# Altium integrated library ALTIUM-WR-FPC-rev18c.IntLib: 212 symbols (part 1 of 2) (continued)
## 686104183822 (continued)
SMT ZIF Connectors WR-FPC, Vertical, Type A, pitch 1 mm, 4 pins; Part Number: 686104183822; Rated Current: 1 A; Contact Resistance: 30 mOhm; Withstanding Voltage: 250 VAC; Working Voltage: 125 VAC; Pin Number: 4; Pitch: 1 mm; Contact Design: Type A; ComponentLink1Description: Manufacturer; ComponentLink1URL: http://www.we-online.de; ComponentLink2Description: Datasheet; ComponentLink2URL: https://katalog.we-online.de/em/datasheet/686104183822.pdf; Published Date: August 2018; Publisher: Wurth Elektronik; Operating Temperature: -25 to 85 degC; Packaging: Tape and Reel; Mounting Technology: SMT; Orientation: Vertical
footprint 686104183822
pins: 1, 2, 3, 4, MP1, MP2, MP3, MP4

## 686105183822
designator J?
SMT ZIF Connectors WR-FPC, Vertical, Type A, pitch 1 mm, 5 pins; Part Number: 686105183822; Rated Current: 1 A; Contact Resistance: 30 mOhm; Withstanding Voltage: 250 VAC; Working Voltage: 125 VAC; Pin Number: 5; Pitch: 1 mm; Contact Design: Type A; ComponentLink1Description: Manufacturer; ComponentLink1URL: http://www.we-online.de; ComponentLink2Description: Datasheet; ComponentLink2URL: https://katalog.we-online.de/em/datasheet/686105183822.pdf; Published Date: August 2018; Publisher: Wurth Elektronik; Operating Temperature: -25 to 85 degC; Packaging: Tape and Reel; Mounting Technology: SMT; Orientation: Vertical
footprint 686105183822
pins: 1, 2, 3, 4, 5, MP1, MP2, MP3, MP4

## 686106148922
designator J?
SMT ZIF Connectors Hinge Type WR-FPC, Horizontal, Bottom Contact, pitch 1 mm, 6 pins; Part Number: 686106148922; Rated Current: 1 A; Contact Resistance: 50 mOhm; Withstanding Voltage: 500 VAC; Working Voltage: 100 VAC; Pin Number: 6; Pitch: 1 mm; ComponentLink1Description: Manufacturer; ComponentLink1URL: http://www.we-online.de; ComponentLink2Description: Datasheet; ComponentLink2URL: https://katalog.we-online.de/em/datasheet/686106148922.pdf; Published Date: August 2018; Publisher: Wurth Elektronik; Operating Temperature: -40 to 105 degC; Packaging: Tape and Reel; Mounting Technology: SMT; Orientation: Horizontal; Contact Design: Bottom Contact
footprint 686106148922
pins: 1, 2, 3, 4, 5, 6, MP1, MP2

## 686106183422
designator J?
SMT ZIF Connectors Low Profile WR-FPC, Horizontal, Top Contact, pitch 1 mm, 6 pins; Part Number: 686106183422; Rated Current: 0.8 A; Contact Resistance: 30 mOhm; Withstanding Voltage: 250 VAC; Working Voltage: 50 VAC; Pin Number: 6; Pitch: 1 mm; ComponentLink1Description: Manufacturer; ComponentLink1URL: http://www.we-online.de; ComponentLink2Description: Datasheet; ComponentLink2URL: https://katalog.we-online.de/em/datasheet/686106183422.pdf; Published Date: August 2018; Publisher: Wurth Elektronik; Operating Temperature: -25 to 85 degC; Packaging: Tape and Reel; Mounting Technology: SMT; Orientation: Horizontal; Contact Design: Top Contact
footprint 686106183422
pins: 1, 2, 3, 4, 5, 6, MP1, MP2

## 686106183522
designator J?
SMT ZIF Connectors Low Profile WR-FPC, Horizontal, Bottom Contact, pitch 1 mm, 6 pins; Part Number: 686106183522; Rated Current: 0.8 A; Contact Resistance: 30 mOhm; Withstanding Voltage: 250 VAC; Working Voltage: 50 VAC; Pin Number: 6; Pitch: 1 mm; ComponentLink1Description: Manufacturer; ComponentLink1URL: http://www.we-online.de; ComponentLink2Description: Datasheet; ComponentLink2URL: https://katalog.we-online.de/em/datasheet/686106183522.pdf; Published Date: August 2018; Publisher: Wurth Elektronik; Operating Temperature: -25 to 85 degC; Packaging: Tape and Reel; Mounting Technology: SMT; Orientation: Horizontal; Contact Design: Bottom Contact
footprint 686106183522
pins: 1, 2, 3, 4, 5, 6, MP1, MP2

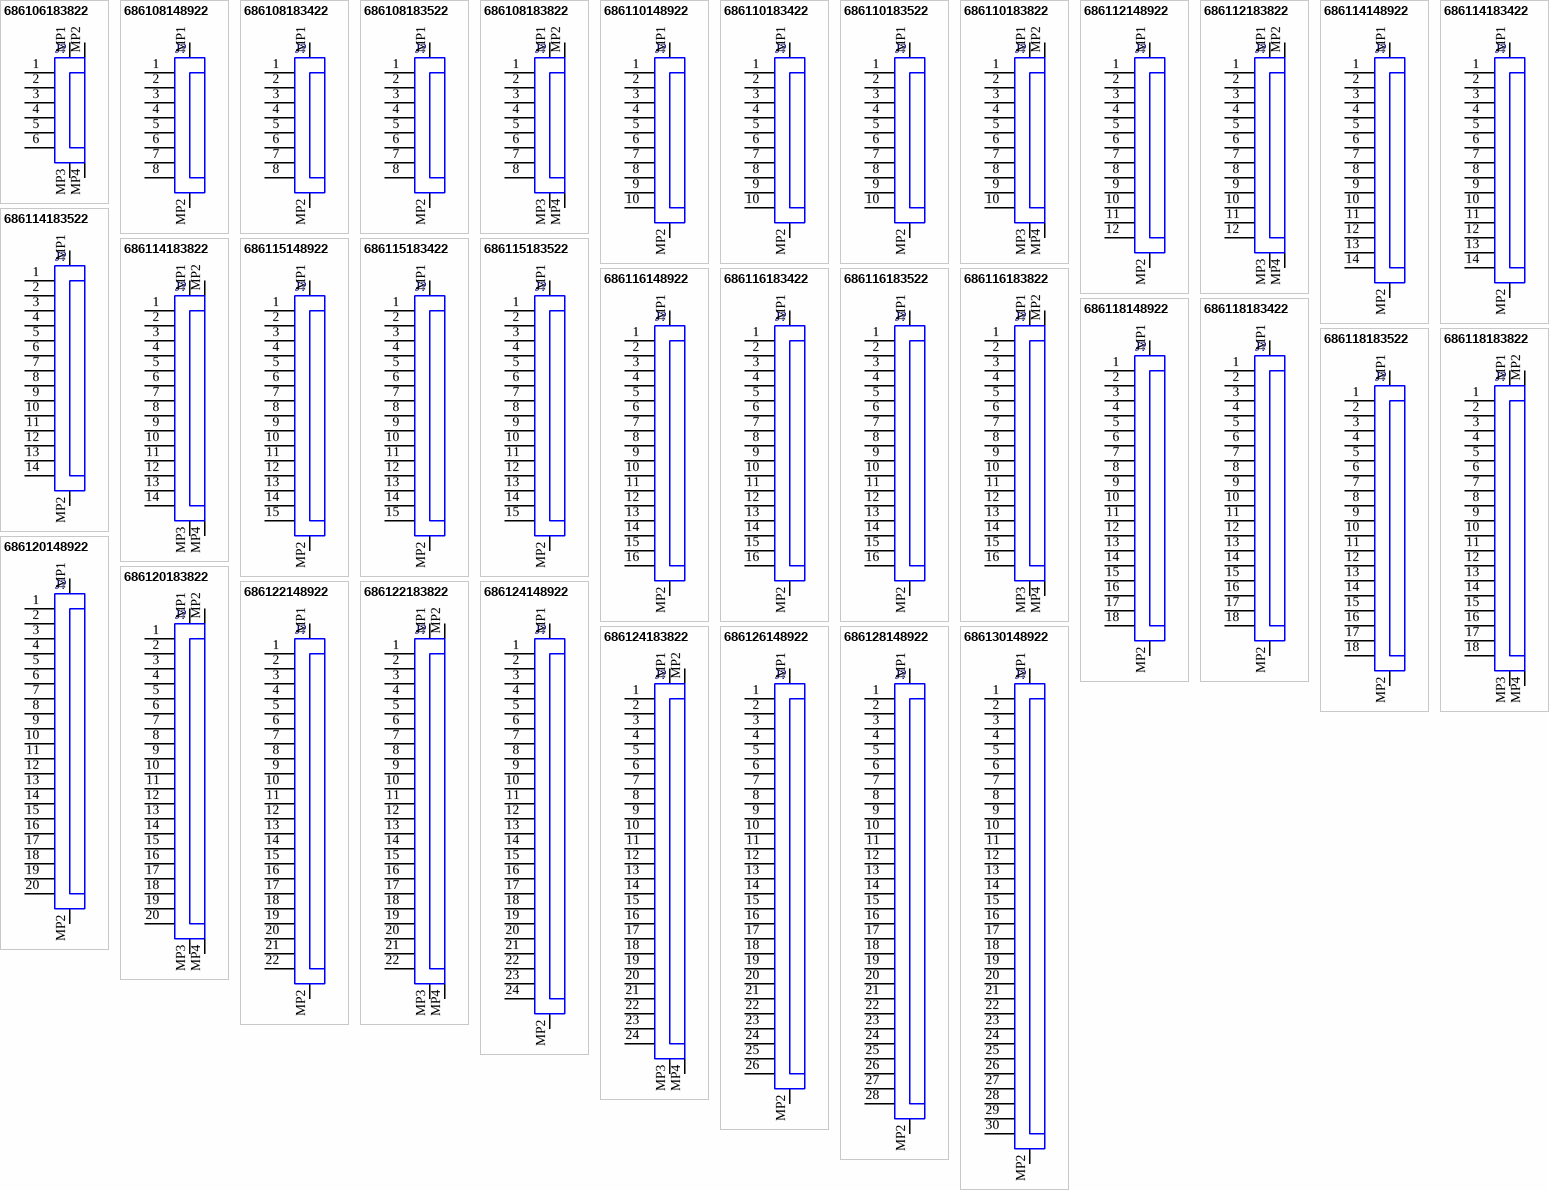
[diagram p1: symbols 686106183822 to 686130148922]

## 686106183822
designator J?
SMT ZIF Connectors WR-FPC, Vertical, Type A, pitch 1 mm, 6 pins; Part Number: 686106183822; Rated Current: 1 A; Contact Resistance: 30 mOhm; Withstanding Voltage: 250 VAC; Working Voltage: 125 VAC; Pin Number: 6; Pitch: 1 mm; Contact Design: Type A; ComponentLink1Description: Manufacturer; ComponentLink1URL: http://www.we-online.de; ComponentLink2Description: Datasheet; ComponentLink2URL: https://katalog.we-online.de/em/datasheet/686106183822.pdf; Published Date: August 2018; Publisher: Wurth Elektronik; Operating Temperature: -25 to 85 degC; Packaging: Tape and Reel; Mounting Technology: SMT; Orientation: Vertical
footprint 686106183822
pins: 1, 2, 3, 4, 5, 6, MP1, MP2, MP3, MP4

## 686108148922
designator J?
SMT ZIF Connectors Hinge Type WR-FPC, Horizontal, Bottom Contact, pitch 1 mm, 8 pins; Part Number: 686108148922; Rated Current: 1 A; Contact Resistance: 50 mOhm; Withstanding Voltage: 500 VAC; Working Voltage: 100 VAC; Pin Number: 8; Pitch: 1 mm; ComponentLink1Description: Manufacturer; ComponentLink1URL: http://www.we-online.de; ComponentLink2Description: Datasheet; ComponentLink2URL: https://katalog.we-online.de/em/datasheet/686108148922.pdf; Published Date: August 2018; Publisher: Wurth Elektronik; Operating Temperature: -40 to 105 degC; Packaging: Tape and Reel; Mounting Technology: SMT; Orientation: Horizontal; Contact Design: Bottom Contact
footprint 686108148922
pins: 1, 2, 3, 4, 5, 6, 7, 8, MP1, MP2

## 686108183422
designator J?
SMT ZIF Connectors Low Profile WR-FPC, Horizontal, Top Contact, pitch 1 mm, 8 pins; Part Number: 686108183422; Rated Current: 0.8 A; Contact Resistance: 30 mOhm; Withstanding Voltage: 250 VAC; Working Voltage: 50 VAC; Pin Number: 8; Pitch: 1 mm; ComponentLink1Description: Manufacturer; ComponentLink1URL: http://www.we-online.de; ComponentLink2Description: Datasheet; ComponentLink2URL: https://katalog.we-online.de/em/datasheet/686108183422.pdf; Published Date: August 2018; Publisher: Wurth Elektronik; Operating Temperature: -25 to 85 degC; Packaging: Tape and Reel; Mounting Technology: SMT; Orientation: Horizontal; Contact Design: Top Contact
footprint 686108183422
pins: 1, 2, 3, 4, 5, 6, 7, 8, MP1, MP2

## 686108183522
designator J?
SMT ZIF Connectors Low Profile WR-FPC, Horizontal, Bottom Contact, pitch 1 mm, 8 pins; Part Number: 686108183522; Rated Current: 0.8 A; Contact Resistance: 30 mOhm; Withstanding Voltage: 250 VAC; Working Voltage: 50 VAC; Pin Number: 8; Pitch: 1 mm; ComponentLink1Description: Manufacturer; ComponentLink1URL: http://www.we-online.de; ComponentLink2Description: Datasheet; ComponentLink2URL: https://katalog.we-online.de/em/datasheet/686108183522.pdf; Published Date: August 2018; Publisher: Wurth Elektronik; Operating Temperature: -25 to 85 degC; Packaging: Tape and Reel; Mounting Technology: SMT; Orientation: Horizontal; Contact Design: Bottom Contact
footprint 686108183522
pins: 1, 2, 3, 4, 5, 6, 7, 8, MP1, MP2

## 686108183822
designator J?
SMT ZIF Connectors WR-FPC, Vertical, Type A, pitch 1 mm, 8 pins; Part Number: 686108183822; Rated Current: 1 A; Contact Resistance: 30 mOhm; Withstanding Voltage: 250 VAC; Working Voltage: 125 VAC; Pin Number: 8; Pitch: 1 mm; Contact Design: Type A; ComponentLink1Description: Manufacturer; ComponentLink1URL: http://www.we-online.de; ComponentLink2Description: Datasheet; ComponentLink2URL: https://katalog.we-online.de/em/datasheet/686108183822.pdf; Published Date: August 2018; Publisher: Wurth Elektronik; Operating Temperature: -25 to 85 degC; Packaging: Tape and Reel; Mounting Technology: SMT; Orientation: Vertical
footprint 686108183822
pins: 1, 2, 3, 4, 5, 6, 7, 8, MP1, MP2, MP3, MP4

## 686110148922
designator J?
SMT ZIF Connectors Hinge Type WR-FPC, Horizontal, Bottom Contact, pitch 1 mm, 10 pins; Part Number: 686110148922; Rated Current: 1 A; Contact Resistance: 50 mOhm; Withstanding Voltage: 500 VAC; Working Voltage: 100 VAC; Pin Number: 10; Pitch: 1 mm; ComponentLink1Description: Manufacturer; ComponentLink1URL: http://www.we-online.de; ComponentLink2Description: Datasheet; ComponentLink2URL: https://katalog.we-online.de/em/datasheet/686110148922.pdf; Published Date: August 2018; Publisher: Wurth Elektronik; Operating Temperature: -40 to 105 degC; Packaging: Tape and Reel; Mounting Technology: SMT; Orientation: Horizontal; Contact Design: Bottom Contact
footprint 686110148922
pins: 1, 2, 3, 4, 5, 6, 7, 8, 9, 10, MP1, MP2

## 686110183422
designator J?
SMT ZIF Connectors Low Profile WR-FPC, Horizontal, Top Contact, pitch 1 mm, 10 pins; Part Number: 686110183422; Rated Current: 0.8 A; Contact Resistance: 30 mOhm; Withstanding Voltage: 250 VAC; Working Voltage: 50 VAC; Pin Number: 10; Pitch: 1 mm; ComponentLink1Description: Manufacturer; ComponentLink1URL: http://www.we-online.de; ComponentLink2Description: Datasheet; ComponentLink2URL: https://katalog.we-online.de/em/datasheet/686110183422.pdf; Published Date: August 2018; Publisher: Wurth Elektronik; Operating Temperature: -25 to 85 degC; Packaging: Tape and Reel; Mounting Technology: SMT; Orientation: Horizontal; Contact Design: Top Contact
footprint 686110183422
pins: 1, 2, 3, 4, 5, 6, 7, 8, 9, 10, MP1, MP2

## 686110183522
designator J?
SMT ZIF Connectors Low Profile WR-FPC, Horizontal, Bottom Contact, pitch 1 mm, 10 pins; Part Number: 686110183522; Rated Current: 0.8 A; Contact Resistance: 30 mOhm; Withstanding Voltage: 250 VAC; Working Voltage: 50 VAC; Pin Number: 10; Pitch: 1 mm; ComponentLink1Description: Manufacturer; ComponentLink1URL: http://www.we-online.de; ComponentLink2Description: Datasheet; ComponentLink2URL: https://katalog.we-online.de/em/datasheet/686110183522.pdf; Published Date: August 2018; Publisher: Wurth Elektronik; Operating Temperature: -25 to 85 degC; Packaging: Tape and Reel; Mounting Technology: SMT; Orientation: Horizontal; Contact Design: Bottom Contact
footprint 686110183522
pins: 1, 2, 3, 4, 5, 6, 7, 8, 9, 10, MP1, MP2

## 686110183822
designator J?
SMT ZIF Connectors WR-FPC, Vertical, Type A, pitch 1 mm, 10 pins; Part Number: 686110183822; Rated Current: 1 A; Contact Resistance: 30 mOhm; Withstanding Voltage: 250 VAC; Working Voltage: 125 VAC; Pin Number: 10; Pitch: 1 mm; Contact Design: Type A; ComponentLink1Description: Manufacturer; ComponentLink1URL: http://www.we-online.de; ComponentLink2Description: Datasheet; ComponentLink2URL: https://katalog.we-online.de/em/datasheet/686110183822.pdf; Published Date: August 2018; Publisher: Wurth Elektronik; Operating Temperature: -25 to 85 degC; Packaging: Tape and Reel; Mounting Technology: SMT; Orientation: Vertical
footprint 686110183822
pins: 1, 2, 3, 4, 5, 6, 7, 8, 9, 10, MP1, MP2, MP3, MP4

## 686112148922
designator J?
SMT ZIF Connectors Hinge Type WR-FPC, Horizontal, Bottom Contact, pitch 1 mm, 12 pins; Part Number: 686112148922; Rated Current: 1 A; Contact Resistance: 50 mOhm; Withstanding Voltage: 500 VAC; Working Voltage: 100 VAC; Pin Number: 12; Pitch: 1 mm; ComponentLink1Description: Manufacturer; ComponentLink1URL: http://www.we-online.de; ComponentLink2Description: Datasheet; ComponentLink2URL: https://katalog.we-online.de/em/datasheet/686112148922.pdf; Published Date: August 2018; Publisher: Wurth Elektronik; Operating Temperature: -40 to 105 degC; Packaging: Tape and Reel; Mounting Technology: SMT; Orientation: Horizontal; Contact Design: Bottom Contact
footprint 686112148922
pins: 1, 2, 3, 4, 5, 6, 7, 8, 9, 10, 11, 12, MP1, MP2

## 686112183822
designator J?
SMT ZIF Connectors WR-FPC, Vertical, Type A, pitch 1 mm, 12 pins; Part Number: 686112183822; Rated Current: 1 A; Contact Resistance: 30 mOhm; Withstanding Voltage: 250 VAC; Working Voltage: 125 VAC; Pin Number: 12; Pitch: 1 mm; Contact Design: Type A; ComponentLink1Description: Manufacturer; ComponentLink1URL: http://www.we-online.de; ComponentLink2Description: Datasheet; ComponentLink2URL: https://katalog.we-online.de/em/datasheet/686112183822.pdf; Published Date: August 2018; Publisher: Wurth Elektronik; Operating Temperature: -25 to 85 degC; Packaging: Tape and Reel; Mounting Technology: SMT; Orientation: Vertical
footprint 686112183822
pins: 1, 2, 3, 4, 5, 6, 7, 8, 9, 10, 11, 12, MP1, MP2, MP3, MP4

## 686114148922
designator J?
SMT ZIF Connectors Hinge Type WR-FPC, Horizontal, Bottom Contact, pitch 1 mm, 14 pins; Part Number: 686114148922; Rated Current: 1 A; Contact Resistance: 50 mOhm; Withstanding Voltage: 500 VAC; Working Voltage: 100 VAC; Pin Number: 14; Pitch: 1 mm; ComponentLink1Description: Manufacturer; ComponentLink1URL: http://www.we-online.de; ComponentLink2Description: Datasheet; ComponentLink2URL: https://katalog.we-online.de/em/datasheet/686114148922.pdf; Published Date: August 2018; Publisher: Wurth Elektronik; Operating Temperature: -40 to 105 degC; Packaging: Tape and Reel; Mounting Technology: SMT; Orientation: Horizontal; Contact Design: Bottom Contact
footprint 686114148922
pins: 1, 2, 3, 4, 5, 6, 7, 8, 9, 10, 11, 12, 13, 14, MP1, MP2

## 686114183422
designator J?
SMT ZIF Connectors Low Profile WR-FPC, Horizontal, Top Contact, pitch 1 mm, 14 pins; Part Number: 686114183422; Rated Current: 0.8 A; Contact Resistance: 30 mOhm; Withstanding Voltage: 250 VAC; Working Voltage: 50 VAC; Pin Number: 14; Pitch: 1 mm; ComponentLink1Description: Manufacturer; ComponentLink1URL: http://www.we-online.de; ComponentLink2Description: Datasheet; ComponentLink2URL: https://katalog.we-online.de/em/datasheet/686114183422.pdf; Published Date: August 2018; Publisher: Wurth Elektronik; Operating Temperature: -25 to 85 degC; Packaging: Tape and Reel; Mounting Technology: SMT; Orientation: Horizontal; Contact Design: Top Contact
footprint 686114183422
pins: 1, 2, 3, 4, 5, 6, 7, 8, 9, 10, 11, 12, 13, 14, MP1, MP2

## 686114183522
designator J?
SMT ZIF Connectors Low Profile WR-FPC, Horizontal, Bottom Contact, pitch 1 mm, 14 pins; Part Number: 686114183522; Rated Current: 0.8 A; Contact Resistance: 30 mOhm; Withstanding Voltage: 250 VAC; Working Voltage: 50 VAC; Pin Number: 14; Pitch: 1 mm; ComponentLink1Description: Manufacturer; ComponentLink1URL: http://www.we-online.de; ComponentLink2Description: Datasheet; ComponentLink2URL: https://katalog.we-online.de/em/datasheet/686114183522.pdf; Published Date: August 2018; Publisher: Wurth Elektronik; Operating Temperature: -25 to 85 degC; Packaging: Tape and Reel; Mounting Technology: SMT; Orientation: Horizontal; Contact Design: Bottom Contact
footprint 686114183522
pins: 1, 2, 3, 4, 5, 6, 7, 8, 9, 10, 11, 12, 13, 14, MP1, MP2

## 686114183822
designator J?
SMT ZIF Connectors WR-FPC, Vertical, Type A, pitch 1 mm, 14 pins; Part Number: 686114183822; Rated Current: 1 A; Contact Resistance: 30 mOhm; Withstanding Voltage: 250 VAC; Working Voltage: 125 VAC; Pin Number: 14; Pitch: 1 mm; Contact Design: Type A; ComponentLink1Description: Manufacturer; ComponentLink1URL: http://www.we-online.de; ComponentLink2Description: Datasheet; ComponentLink2URL: https://katalog.we-online.de/em/datasheet/686114183822.pdf; Published Date: August 2018; Publisher: Wurth Elektronik; Operating Temperature: -25 to 85 degC; Packaging: Tape and Reel; Mounting Technology: SMT; Orientation: Vertical
footprint 686114183822
pins: 1, 2, 3, 4, 5, 6, 7, 8, 9, 10, 11, 12, 13, 14, MP1, MP2, MP3, MP4

## 686115148922
designator J?
SMT ZIF Connectors Hinge Type WR-FPC, Horizontal, Bottom Contact, pitch 1 mm, 15 pins; Part Number: 686115148922; Rated Current: 1 A; Contact Resistance: 50 mOhm; Withstanding Voltage: 500 VAC; Working Voltage: 100 VAC; Pin Number: 15; Pitch: 1 mm; ComponentLink1Description: Manufacturer; ComponentLink1URL: http://www.we-online.de; ComponentLink2Description: Datasheet; ComponentLink2URL: https://katalog.we-online.de/em/datasheet/686115148922.pdf; Published Date: August 2018; Publisher: Wurth Elektronik; Operating Temperature: -40 to 105 degC; Packaging: Tape and Reel; Mounting Technology: SMT; Orientation: Horizontal; Contact Design: Bottom Contact
footprint 686115148922
pins: 1, 2, 3, 4, 5, 6, 7, 8, 9, 10, 11, 12, 13, 14, 15, MP1, MP2

## 686115183422
designator J?
SMT ZIF Connectors Low Profile WR-FPC, Horizontal, Top Contact, pitch 1 mm, 15 pins; Part Number: 686115183422; Rated Current: 0.8 A; Contact Resistance: 30 mOhm; Withstanding Voltage: 250 VAC; Working Voltage: 50 VAC; Pin Number: 15; Pitch: 1 mm; ComponentLink1Description: Manufacturer; ComponentLink1URL: http://www.we-online.de; ComponentLink2Description: Datasheet; ComponentLink2URL: https://katalog.we-online.de/em/datasheet/686115183422.pdf; Published Date: August 2018; Publisher: Wurth Elektronik; Operating Temperature: -25 to 85 degC; Packaging: Tape and Reel; Mounting Technology: SMT; Orientation: Horizontal; Contact Design: Top Contact
footprint 686115183422
pins: 1, 2, 3, 4, 5, 6, 7, 8, 9, 10, 11, 12, 13, 14, 15, MP1, MP2

## 686115183522
designator J?
SMT ZIF Connectors Low Profile WR-FPC, Horizontal, Bottom Contact, pitch 1 mm, 15 pins; Part Number: 686115183522; Rated Current: 0.8 A; Contact Resistance: 30 mOhm; Withstanding Voltage: 250 VAC; Working Voltage: 50 VAC; Pin Number: 15; Pitch: 1 mm; ComponentLink1Description: Manufacturer; ComponentLink1URL: http://www.we-online.de; ComponentLink2Description: Datasheet; ComponentLink2URL: https://katalog.we-online.de/em/datasheet/686115183522.pdf; Published Date: August 2018; Publisher: Wurth Elektronik; Operating Temperature: -25 to 85 degC; Packaging: Tape and Reel; Mounting Technology: SMT; Orientation: Horizontal; Contact Design: Bottom Contact
footprint 686115183522
pins: 1, 2, 3, 4, 5, 6, 7, 8, 9, 10, 11, 12, 13, 14, 15, MP1, MP2

## 686116148922
designator J?
SMT ZIF Connectors Hinge Type WR-FPC, Horizontal, Bottom Contact, pitch 1 mm, 16 pins; Part Number: 686116148922; Rated Current: 1 A; Contact Resistance: 50 mOhm; Withstanding Voltage: 500 VAC; Working Voltage: 100 VAC; Pin Number: 16; Pitch: 1 mm; ComponentLink1Description: Manufacturer; ComponentLink1URL: http://www.we-online.de; ComponentLink2Description: Datasheet; ComponentLink2URL: https://katalog.we-online.de/em/datasheet/686116148922.pdf; Published Date: August 2018; Publisher: Wurth Elektronik; Operating Temperature: -40 to 105 degC; Packaging: Tape and Reel; Mounting Technology: SMT; Orientation: Horizontal; Contact Design: Bottom Contact
footprint 686116148922
pins: 1, 2, 3, 4, 5, 6, 7, 8, 9, 10, 11, 12, 13, 14, 15, 16, MP1, MP2

## 686116183422
designator J?
SMT ZIF Connectors Low Profile WR-FPC, Horizontal, Top Contact, pitch 1 mm, 16 pins; Part Number: 686116183422; Rated Current: 0.8 A; Contact Resistance: 30 mOhm; Withstanding Voltage: 250 VAC; Working Voltage: 50 VAC; Pin Number: 16; Pitch: 1 mm; ComponentLink1Description: Manufacturer; ComponentLink1URL: http://www.we-online.de; ComponentLink2Description: Datasheet; ComponentLink2URL: https://katalog.we-online.de/em/datasheet/686116183422.pdf; Published Date: August 2018; Publisher: Wurth Elektronik; Operating Temperature: -25 to 85 degC; Packaging: Tape and Reel; Mounting Technology: SMT; Orientation: Horizontal; Contact Design: Top Contact
footprint 686116183422
pins: 1, 2, 3, 4, 5, 6, 7, 8, 9, 10, 11, 12, 13, 14, 15, 16, MP1, MP2

## 686116183522
designator J?
SMT ZIF Connectors Low Profile WR-FPC, Horizontal, Bottom Contact, pitch 1 mm, 16 pins; Part Number: 686116183522; Rated Current: 0.8 A; Contact Resistance: 30 mOhm; Withstanding Voltage: 250 VAC; Working Voltage: 50 VAC; Pin Number: 16; Pitch: 1 mm; ComponentLink1Description: Manufacturer; ComponentLink1URL: http://www.we-online.de; ComponentLink2Description: Datasheet; ComponentLink2URL: https://katalog.we-online.de/em/datasheet/686116183522.pdf; Published Date: August 2018; Publisher: Wurth Elektronik; Operating Temperature: -25 to 85 degC; Packaging: Tape and Reel; Mounting Technology: SMT; Orientation: Horizontal; Contact Design: Bottom Contact
footprint 686116183522
pins: 1, 2, 3, 4, 5, 6, 7, 8, 9, 10, 11, 12, 13, 14, 15, 16, MP1, MP2

## 686116183822
designator J?
SMT ZIF Connectors WR-FPC, Vertical, Type A, pitch 1 mm, 16 pins; Part Number: 686116183822; Rated Current: 1 A; Contact Resistance: 30 mOhm; Withstanding Voltage: 250 VAC; Working Voltage: 125 VAC; Pin Number: 16; Pitch: 1 mm; Contact Design: Type A; ComponentLink1Description: Manufacturer; ComponentLink1URL: http://www.we-online.de; ComponentLink2Description: Datasheet; ComponentLink2URL: https://katalog.we-online.de/em/datasheet/686116183822.pdf; Published Date: August 2018; Publisher: Wurth Elektronik; Operating Temperature: -25 to 85 degC; Packaging: Tape and Reel; Mounting Technology: SMT; Orientation: Vertical
footprint 686116183822
pins: 1, 2, 3, 4, 5, 6, 7, 8, 9, 10, 11, 12, 13, 14, 15, 16, MP1, MP2, MP3, MP4

## 686118148922
designator J?
SMT ZIF Connectors Hinge Type WR-FPC, Horizontal, Bottom Contact, pitch 1 mm, 18 pins; Part Number: 686118148922; Rated Current: 1 A; Contact Resistance: 50 mOhm; Withstanding Voltage: 500 VAC; Working Voltage: 100 VAC; Pin Number: 18; Pitch: 1 mm; ComponentLink1Description: Manufacturer; ComponentLink1URL: http://www.we-online.de; ComponentLink2Description: Datasheet; ComponentLink2URL: https://katalog.we-online.de/em/datasheet/686118148922.pdf; Published Date: August 2018; Publisher: Wurth Elektronik; Operating Temperature: -40 to 105 degC; Packaging: Tape and Reel; Mounting Technology: SMT; Orientation: Horizontal; Contact Design: Bottom Contact
footprint 686118148922
pins: 1, 2, 3, 4, 5, 6, 7, 8, 9, 10, 11, 12, 13, 14, 15, 16, 17, 18, MP1, MP2

## 686118183422
designator J?
SMT ZIF Connectors Low Profile WR-FPC, Horizontal, Top Contact, pitch 1 mm, 18 pins; Part Number: 686118183422; Rated Current: 0.8 A; Contact Resistance: 30 mOhm; Withstanding Voltage: 250 VAC; Working Voltage: 50 VAC; Pin Number: 18; Pitch: 1 mm; ComponentLink1Description: Manufacturer; ComponentLink1URL: http://www.we-online.de; ComponentLink2Description: Datasheet; ComponentLink2URL: https://katalog.we-online.de/em/datasheet/686118183422.pdf; Published Date: August 2018; Publisher: Wurth Elektronik; Operating Temperature: -25 to 85 degC; Packaging: Tape and Reel; Mounting Technology: SMT; Orientation: Horizontal; Contact Design: Top Contact
footprint 686118183422
pins: 1, 2, 3, 4, 5, 6, 7, 8, 9, 10, 11, 12, 13, 14, 15, 16, 17, 18, MP1, MP2

## 686118183522
designator J?
SMT ZIF Connectors Low Profile WR-FPC, Horizontal, Bottom Contact, pitch 1 mm, 18 pins; Part Number: 686118183522; Rated Current: 0.8 A; Contact Resistance: 30 mOhm; Withstanding Voltage: 250 VAC; Working Voltage: 50 VAC; Pin Number: 18; Pitch: 1 mm; ComponentLink1Description: Manufacturer; ComponentLink1URL: http://www.we-online.de; ComponentLink2Description: Datasheet; ComponentLink2URL: https://katalog.we-online.de/em/datasheet/686118183522.pdf; Published Date: August 2018; Publisher: Wurth Elektronik; Operating Temperature: -25 to 85 degC; Packaging: Tape and Reel; Mounting Technology: SMT; Orientation: Horizontal; Contact Design: Bottom Contact
footprint 686118183522
pins: 1, 2, 3, 4, 5, 6, 7, 8, 9, 10, 11, 12, 13, 14, 15, 16, 17, 18, MP1, MP2

## 686118183822
designator J?
SMT ZIF Connectors WR-FPC, Vertical, Type A, pitch 1 mm, 18 pins; Part Number: 686118183822; Rated Current: 1 A; Contact Resistance: 30 mOhm; Withstanding Voltage: 250 VAC; Working Voltage: 125 VAC; Pin Number: 18; Pitch: 1 mm; Contact Design: Type A; ComponentLink1Description: Manufacturer; ComponentLink1URL: http://www.we-online.de; ComponentLink2Description: Datasheet; ComponentLink2URL: https://katalog.we-online.de/em/datasheet/686118183822.pdf; Published Date: August 2018; Publisher: Wurth Elektronik; Operating Temperature: -25 to 85 degC; Packaging: Tape and Reel; Mounting Technology: SMT; Orientation: Vertical
footprint 686118183822
pins: 1, 2, 3, 4, 5, 6, 7, 8, 9, 10, 11, 12, 13, 14, 15, 16, 17, 18, MP1, MP2, MP3, MP4

## 686120148922
designator J?
SMT ZIF Connectors Hinge Type WR-FPC, Horizontal, Bottom Contact, pitch 1 mm, 20 pins; Part Number: 686120148922; Rated Current: 1 A; Contact Resistance: 50 mOhm; Withstanding Voltage: 500 VAC; Working Voltage: 100 VAC; Pin Number: 20; Pitch: 1 mm; ComponentLink1Description: Manufacturer; ComponentLink1URL: http://www.we-online.de; ComponentLink2Description: Datasheet; ComponentLink2URL: https://katalog.we-online.de/em/datasheet/686120148922.pdf; Published Date: August 2018; Publisher: Wurth Elektronik; Operating Temperature: -40 to 105 degC; Packaging: Tape and Reel; Mounting Technology: SMT; Orientation: Horizontal; Contact Design: Bottom Contact
footprint 686120148922
pins: 1, 2, 3, 4, 5, 6, 7, 8, 9, 10, 11, 12, 13, 14, 15, 16, 17, 18, 19, 20, MP1, MP2

## 686120183822
designator J?
SMT ZIF Connectors WR-FPC, Vertical, Type A, pitch 1 mm, 20 pins; Part Number: 686120183822; Rated Current: 1 A; Contact Resistance: 30 mOhm; Withstanding Voltage: 250 VAC; Working Voltage: 125 VAC; Pin Number: 20; Pitch: 1 mm; Contact Design: Type A; ComponentLink1Description: Manufacturer; ComponentLink1URL: http://www.we-online.de; ComponentLink2Description: Datasheet; ComponentLink2URL: https://katalog.we-online.de/em/datasheet/686120183822.pdf; Published Date: August 2018; Publisher: Wurth Elektronik; Operating Temperature: -25 to 85 degC; Packaging: Tape and Reel; Mounting Technology: SMT; Orientation: Vertical
footprint 686120183822
pins: 1, 2, 3, 4, 5, 6, 7, 8, 9, 10, 11, 12, 13, 14, 15, 16, 17, 18, 19, 20, MP1, MP2, MP3, MP4

## 686122148922
designator J?
SMT ZIF Connectors Hinge Type WR-FPC, Horizontal, Bottom Contact, pitch 1 mm, 22 pins; Part Number: 686122148922; Rated Current: 1 A; Contact Resistance: 50 mOhm; Withstanding Voltage: 500 VAC; Working Voltage: 100 VAC; Pin Number: 22; Pitch: 1 mm; ComponentLink1Description: Manufacturer; ComponentLink1URL: http://www.we-online.de; ComponentLink2Description: Datasheet; ComponentLink2URL: https://katalog.we-online.de/em/datasheet/686122148922.pdf; Published Date: August 2018; Publisher: Wurth Elektronik; Operating Temperature: -40 to 105 degC; Packaging: Tape and Reel; Mounting Technology: SMT; Orientation: Horizontal; Contact Design: Bottom Contact
footprint 686122148922
pins: 1, 2, 3, 4, 5, 6, 7, 8, 9, 10, 11, 12, 13, 14, 15, 16, 17, 18, 19, 20, 21, 22, MP1, MP2

## 686122183822
designator J?
SMT ZIF Connectors WR-FPC, Vertical, Type A, pitch 1 mm, 22 pins; Part Number: 686122183822; Rated Current: 1 A; Contact Resistance: 30 mOhm; Withstanding Voltage: 250 VAC; Working Voltage: 125 VAC; Pin Number: 22; Pitch: 1 mm; Contact Design: Type A; ComponentLink1Description: Manufacturer; ComponentLink1URL: http://www.we-online.de; ComponentLink2Description: Datasheet; ComponentLink2URL: https://katalog.we-online.de/em/datasheet/686122183822.pdf; Published Date: August 2018; Publisher: Wurth Elektronik; Operating Temperature: -25 to 85 degC; Packaging: Tape and Reel; Mounting Technology: SMT; Orientation: Vertical
footprint 686122183822
pins: 1, 2, 3, 4, 5, 6, 7, 8, 9, 10, 11, 12, 13, 14, 15, 16, 17, 18, 19, 20, 21, 22, MP1, MP2, MP3, MP4

## 686124148922
designator J?
SMT ZIF Connectors Hinge Type WR-FPC, Horizontal, Bottom Contact, pitch 1 mm, 24 pins; Part Number: 686124148922; Rated Current: 1 A; Contact Resistance: 50 mOhm; Withstanding Voltage: 500 VAC; Working Voltage: 100 VAC; Pin Number: 24; Pitch: 1 mm; ComponentLink1Description: Manufacturer; ComponentLink1URL: http://www.we-online.de; ComponentLink2Description: Datasheet; ComponentLink2URL: https://katalog.we-online.de/em/datasheet/686124148922.pdf; Published Date: August 2018; Publisher: Wurth Elektronik; Operating Temperature: -40 to 105 degC; Packaging: Tape and Reel; Mounting Technology: SMT; Orientation: Horizontal; Contact Design: Bottom Contact
footprint 686124148922
pins: 1, 2, 3, 4, 5, 6, 7, 8, 9, 10, 11, 12, 13, 14, 15, 16, 17, 18, 19, 20, 21, 22, 23, 24, MP1, MP2

## 686124183822
designator J?